# Altium footprint library discret_ic.pcblib: 55 footprints (part 1 of 4)
Each footprint in its own frame and in the unit in brackets; x right, y up, seen from the top. Pads: shape width x height; smd on the part's side, far side on the other; paste and mask are expansions set on the pad; w line width, h text height; cw(c..) or ccw(c..) is an arc to the next point about the centre after c.
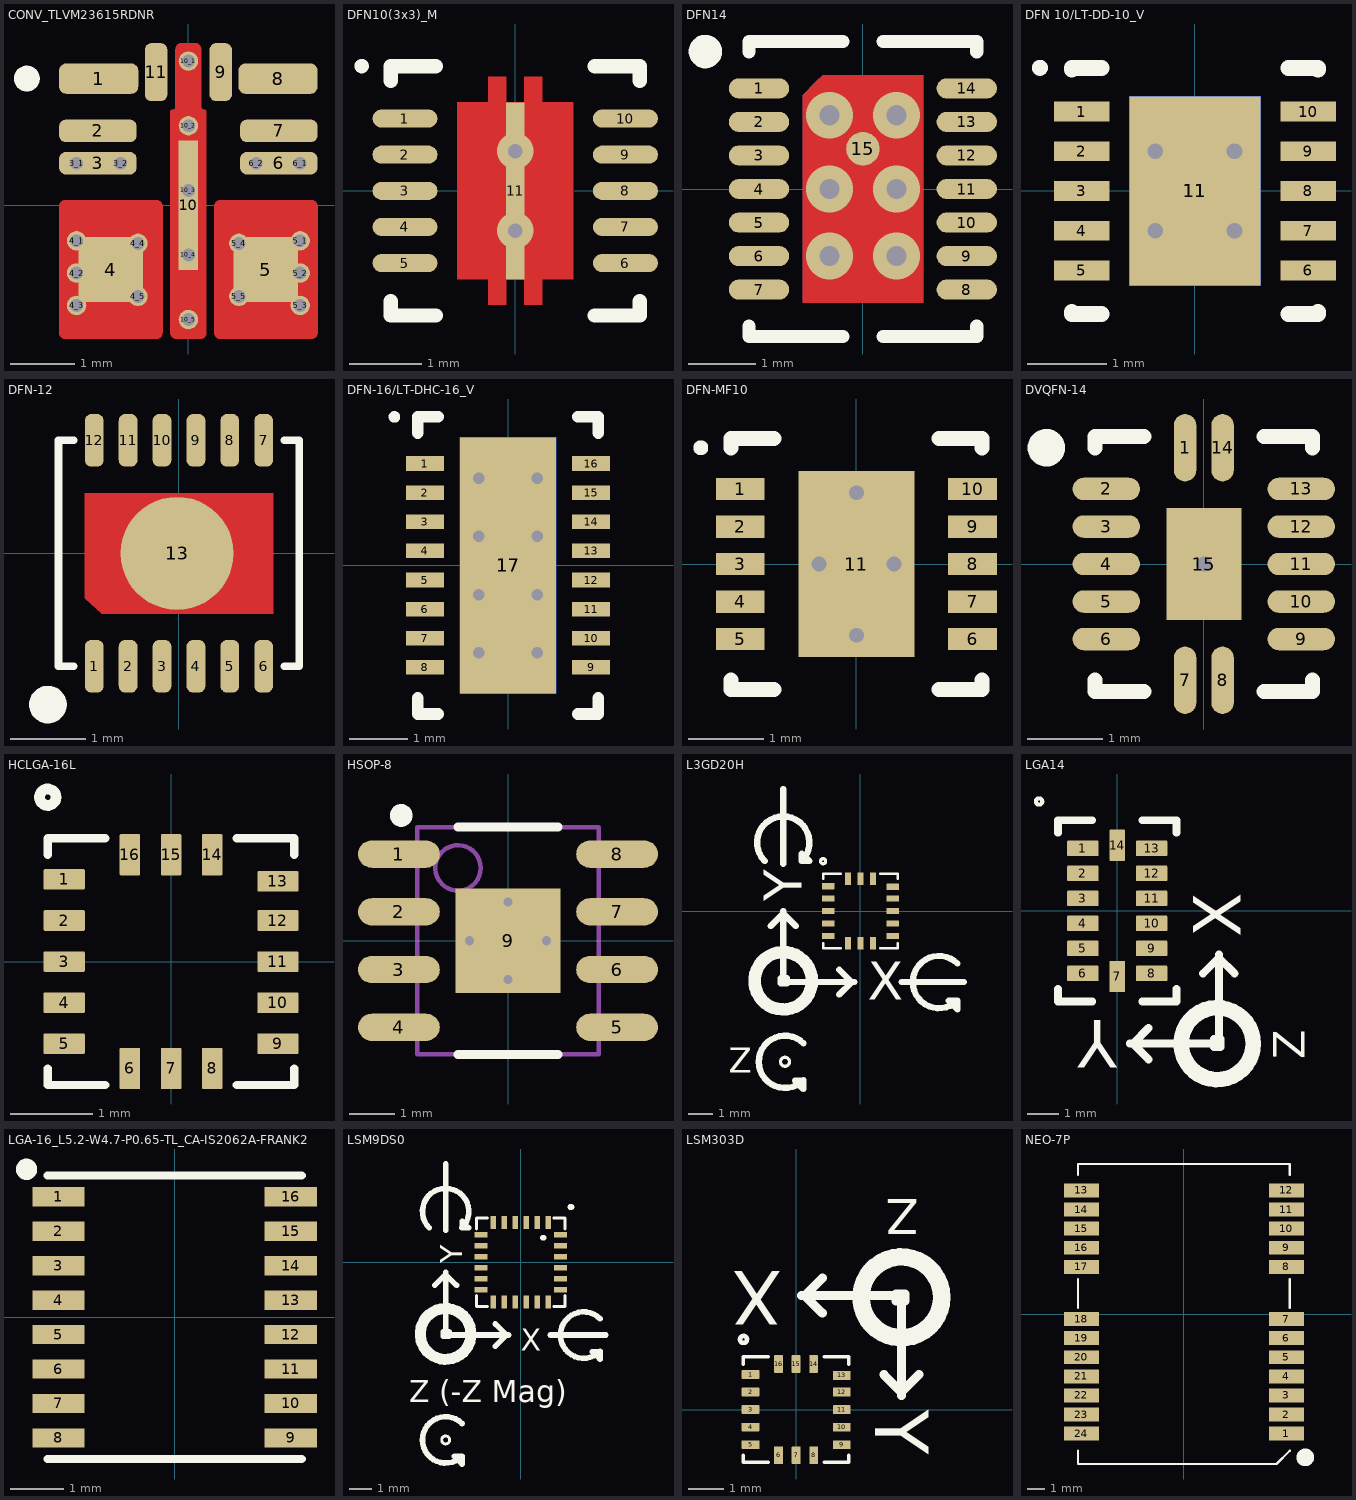
[diagram p0: the footprints below, top view; thin cyan lines are the x and y axes]

## CONV_TLVM23615RDNR [mm]
pads (30):
  rrect45% 1.225x0.47 smd paste-2 mask+0: 1(-1.388,1.96) 8(1.388,1.96)
  rrect60% 1.2x0.35 smd paste-2 mask+0: 2(-1.4,1.15) 3(-1.4,0.65) 6(1.4,0.65) 7(1.4,1.15)
  round 0.3 hole 0.2 mask+0: 3_1(-1.729,0.65) 3_2(-1.05,0.65) 4_1(-1.73,-0.55) 4_2(-1.73,-1.05) 4_3(-1.73,-1.55) 4_4(-0.78,-0.59) 4_5(-0.78,-1.41) 5_1(1.73,-0.55) 5_2(1.73,-1.05) 5_3(1.73,-1.55) 5_4(0.78,-0.59) 5_5(0.78,-1.41) 6_1(1.729,0.65) 6_2(1.05,0.65) 10_1(0,2.23) 10_2(0,1.23) 10_3(0,0.23) 10_4(0,-0.77) 10_5(0,-1.77)
  rect 1x1 smd paste-1 mask+0: 4(-1.2,-0.995) 5(1.2,-0.995)
  rrect60% 0.35x0.9 smd paste-1 mask+0: 9(0.5,2.06) 11(-0.5,2.06)
  rect 0.3x2 smd paste-2 mask+0: 10(0,0)
Top Layer:
  region: -0.49,0.079 -0.484,0.079 -0.479,0.078 -0.474,0.077 -0.469,0.075 -0.464,0.073 -0.459,0.071 -0.455,0.069 -0.45,0.067 -0.446,0.064 -0.441,0.061 -0.437,0.058 -0.433,0.054 -0.429,0.051 -0.426,0.047 -0.422,0.043 -0.419,0.039 -0.416,0.034 -0.413,0.03 -0.411,0.025 -0.409,0.021 -0.407,0.016 -0.405,0.011 -0.403,0.006 -0.402,0.001 -0.401,-0.004 -0.401,-0.01 -0.4,-0.015 -0.4,-0.02 -0.4,-1.97 -0.4,-1.975 -0.401,-1.98 -0.401,-1.986 -0.402,-1.991 -0.403,-1.996 -0.405,-2.001 -0.407,-2.006 -0.409,-2.011 -0.411,-2.015 -0.413,-2.02 -0.416,-2.024 -0.419,-2.029 -0.422,-2.033 -0.426,-2.037 -0.429,-2.041 -0.433,-2.044 -0.437,-2.048 -0.441,-2.051 -0.446,-2.054 -0.45,-2.057 -0.455,-2.059 -0.459,-2.061 -0.464,-2.063 -0.469,-2.065 -0.474,-2.067 -0.479,-2.068 -0.484,-2.069 -0.49,-2.069 -0.495,-2.07 -1.905,-2.07 -1.91,-2.069 -1.916,-2.069 -1.921,-2.068 -1.926,-2.067 -1.931,-2.065 -1.936,-2.063 -1.941,-2.061 -1.945,-2.059 -1.95,-2.057 -1.954,-2.054 -1.959,-2.051 -1.963,-2.048 -1.967,-2.044 -1.971,-2.041 -1.974,-2.037 -1.978,-2.033 -1.981,-2.029 -1.984,-2.024 -1.987,-2.02 -1.989,-2.015 -1.991,-2.011 -1.993,-2.006 -1.995,-2.001 -1.997,-1.996 -1.998,-1.991 -1.999,-1.986 -1.999,-1.98 -2,-1.975 -2,-1.97 -2,-0.02 -2,-0.015 -1.999,-0.01 -1.999,-0.004 -1.998,0.001 -1.997,0.006 -1.995,0.011 -1.993,0.016 -1.991,0.021 -1.989,0.025 -1.987,0.03 -1.984,0.034 -1.981,0.039 -1.978,0.043 -1.974,0.047 -1.971,0.051 -1.967,0.054 -1.963,0.058 -1.959,0.061 -1.954,0.064 -1.95,0.067 -1.945,0.069 -1.941,0.071 -1.936,0.073 -1.931,0.075 -1.926,0.077 -1.921,0.078 -1.916,0.079 -1.91,0.079 -1.905,0.08 -0.495,0.08
  region: 232 vertices and 0 holes, not listed, extent -0.28,-2.07 0.28,2.51
  region: 1.91,0.079 1.916,0.079 1.921,0.078 1.926,0.077 1.931,0.075 1.936,0.073 1.941,0.071 1.945,0.069 1.95,0.067 1.954,0.064 1.959,0.061 1.963,0.058 1.967,0.054 1.971,0.051 1.974,0.047 1.978,0.043 1.981,0.039 1.984,0.034 1.987,0.03 1.989,0.025 1.991,0.021 1.993,0.016 1.995,0.011 1.997,0.006 1.998,0.001 1.999,-0.004 1.999,-0.01 2,-0.015 2,-0.02 2,-1.97 2,-1.975 1.999,-1.98 1.999,-1.986 1.998,-1.991 1.997,-1.996 1.995,-2.001 1.993,-2.006 1.991,-2.011 1.989,-2.015 1.987,-2.02 1.984,-2.024 1.981,-2.029 1.978,-2.033 1.974,-2.037 1.971,-2.041 1.967,-2.044 1.963,-2.048 1.959,-2.051 1.954,-2.054 1.95,-2.057 1.945,-2.059 1.941,-2.061 1.936,-2.063 1.931,-2.065 1.926,-2.067 1.921,-2.068 1.916,-2.069 1.91,-2.069 1.905,-2.07 0.495,-2.07 0.49,-2.069 0.484,-2.069 0.479,-2.068 0.474,-2.067 0.469,-2.065 0.464,-2.063 0.459,-2.061 0.455,-2.059 0.45,-2.057 0.446,-2.054 0.441,-2.051 0.437,-2.048 0.433,-2.044 0.429,-2.041 0.426,-2.037 0.422,-2.033 0.419,-2.029 0.416,-2.024 0.413,-2.02 0.411,-2.015 0.409,-2.011 0.407,-2.006 0.405,-2.001 0.403,-1.996 0.402,-1.991 0.401,-1.986 0.401,-1.98 0.4,-1.975 0.4,-1.97 0.4,-0.02 0.4,-0.015 0.401,-0.01 0.401,-0.004 0.402,0.001 0.403,0.006 0.405,0.011 0.407,0.016 0.409,0.021 0.411,0.025 0.413,0.03 0.416,0.034 0.419,0.039 0.422,0.043 0.426,0.047 0.429,0.051 0.433,0.054 0.437,0.058 0.441,0.061 0.446,0.064 0.45,0.067 0.455,0.069 0.459,0.071 0.464,0.073 0.469,0.075 0.474,0.077 0.479,0.078 0.484,0.079 0.49,0.079 0.495,0.08 1.905,0.08
Top Overlay:
  circle w0.2: c-2.5,1.96 r0.1
Top Paste:
  drawing of 23 lines, arcs and shapes, not listed
Top Solder:
  drawing of 11 lines, arcs and shapes, not listed
3D body "step_temp.STEP": height 2.1, standoff 0, extent -1.75,-2.25 1.75,2.25

## DFN10(3x3)_M [mm] "SON, 10-Leads, Body 3x3mm, Pitch 0.5mm, Thermal Pad 2.45x1.6mm, IPC Low Density"
height 1
pads (11):
  oval 0.9x0.25 smd: 1(-1.525,1) 2(-1.525,0.5) 3(-1.525,0) 4(-1.525,-0.5) 5(-1.525,-1) 6(1.525,-1) 7(1.525,-0.5) 8(1.525,0) 9(1.525,0.5) 10(1.525,1)
  rect 0.25x2.45 smd paste+0 mask+0: 11(0,0)
via 0,0.55 diameter 0.5 hole 0.2
via 0,-0.55 diameter 0.5 hole 0.2
Top Layer:
  region: -0.8,-1.225 -0.375,-1.225 -0.375,-1.575 -0.125,-1.575 -0.125,-1.225 0.125,-1.225 0.125,-1.575 0.375,-1.575 0.375,-1.225 0.8,-1.225 0.8,1.225 0.375,1.225 0.375,1.575 0.125,1.575 0.125,1.225 -0.125,1.225 -0.125,1.575 -0.375,1.575 -0.375,1.225 -0.8,1.225
Top Overlay:
  circle w0.1: c-2.125,1.725 r0.05
  lines w0.2: -1.725,-1.525 -1.725,-1.725 -1.1,-1.725 ; -1.725,1.525 -1.725,1.725 -1.1,1.725 ; 1.1,-1.725 1.725,-1.725 1.725,-1.525 ; 1.1,1.725 1.725,1.725 1.725,1.525
3D body "User Library-My-DFN-10-3x3-0_5.STEP": height 0.8, standoff 0, extent -1.57,-1.55 1.55,1.55

## DFN14 [mm]
pads (15):
  oval 0.9x0.3 smd: 1(-1.55,1.5) 2(-1.55,1) 3(-1.55,0.5) 4(-1.55,0) 5(-1.55,-0.5) 6(-1.55,-1) 7(-1.55,-1.5) 8(1.55,-1.5) 9(1.55,-1) 10(1.55,-0.5) 11(1.55,0) 12(1.55,0.5) 13(1.55,1) 14(1.55,1.5)
  round 0.5 smd: 15(0,0.6)
via -0.5,1.1 diameter 0.7 hole 0.3
via 0.5,1.1 diameter 0.7 hole 0.3
via -0.5,0 diameter 0.7 hole 0.3
via 0.5,0 diameter 0.7 hole 0.3
via -0.5,-1 diameter 0.7 hole 0.3
via 0.5,-1 diameter 0.7 hole 0.3
Top Layer:
  region: -0.9,-1.7 -0.9,1.4 -0.7,1.6 -0.6,1.7 0.9,1.7 0.9,-1.7
Bottom Layer:
  region: -0.9,-1.7 -0.9,1.4 -0.7,1.6 -0.6,1.7 0.9,1.7 0.9,-1.7
Top Overlay:
  circle w0.25: c-2.35,2.05 r0.125
  lines w0.2: -1.7,-2.05 -1.7,-2.2 -0.3,-2.2 ; -1.7,2.05 -1.7,2.2 -0.3,2.2 ; 0.3,-2.2 1.7,-2.2 1.7,-2.05 ; 0.3,2.2 1.7,2.2 1.7,2.05
Top Solder:
  region: -0.9,-1.7 -0.9,1.4 -0.7,1.6 -0.6,1.7 0.9,1.7 0.9,-1.7
3D body "User Library-LT3479EDE#PBF-2.step": height 0.75, standoff 0, extent -1.5,-2 1.5,2

## DFN 10/LT-DD-10_V [mm] "SON, 10-Leads, Body 3x3mm, Pitch 0.5mm, Thermal Pad 2.38x1.65mm"
height 0.8
pads (12):
  rect 0.7x0.25 smd mask+0.102: 1(-1.425,1) 2(-1.425,0.5) 3(-1.425,0) 4(-1.425,-0.5) 5(-1.425,-1) 6(1.425,-1) 7(1.425,-0.5) 8(1.425,0) 9(1.425,0.5) 10(1.425,1)
  rect 1.65x2.38 smd mask+0.102: 11(0,0)
  rect 1.65x2.38 smd far side mask+0.102: 11(0,0)
via -0.5,0.5 diameter 0.5 hole 0.2
via 0.5,0.5 diameter 0.5 hole 0.2
via -0.5,-0.5 diameter 0.5 hole 0.2
via 0.5,-0.5 diameter 0.5 hole 0.2
Top Overlay:
  circle w0.1: c-1.95,1.55 r0.05
  lines w0.2: -1.55,-1.525 -1.55,-1.55 -1.175,-1.55 ; -1.55,1.525 -1.55,1.55 -1.175,1.55 ; 1.175,-1.55 1.55,-1.55 1.55,-1.525 ; 1.175,1.55 1.55,1.55 1.55,1.525
3D body "User Library-DFN10-1.STEP": height 0.8, standoff 0, extent -1.51,-1.5 1.51,1.5

## DFN-12 [mm]
pads (13):
  rrect70% 0.25x0.7 smd mask+0.05: 1(-1.125,-1.5) 2(-0.675,-1.5) 3(-0.225,-1.5) 4(0.225,-1.5) 5(0.675,-1.5) 6(1.125,-1.5) 7(1.125,1.5) 8(0.675,1.5) 9(0.225,1.5) 10(-0.225,1.5) 11(-0.675,1.5) 12(-1.125,1.5)
  round 1.5 smd paste+0 mask+0: 13(-0.025,0)
Top Layer:
  region: -1.25,0.8 1.25,0.8 1.25,-0.8 -1.025,-0.8 -1.25,-0.6
Top Overlay:
  circle w0.25: c-1.74,-2.009 r0.125
  lines w0.1: -1.4,-1.5 -1.6,-1.5 -1.6,1.5 -1.4,1.5 ; 1.4,-1.5 1.6,-1.5 1.6,1.5 1.4,1.5
Top Solder:
  region: -1.25,0.8 1.25,0.8 1.25,-0.8 -1.025,-0.8 -1.25,-0.6
3D body "User Library-DFN12(3x3).step": height 0.76, standoff 0, extent -1.5,-1.5 1.5,1.502

## DFN-16/LT-DHC-16_V [mm] "SON, 16-Leads, Body 5x3mm, Pitch 0.5mm, Thermal Pad 4.4X1.65mm"
height 0.8
pads (18):
  rect 0.65x0.25 smd: 1(-1.425,1.75) 2(-1.425,1.25) 3(-1.425,0.75) 4(-1.425,0.25) 5(-1.425,-0.25) 6(-1.425,-0.75) 7(-1.425,-1.25) 8(-1.425,-1.75) 9(1.425,-1.75) 10(1.425,-1.25) 11(1.425,-0.75) 12(1.425,-0.25) 13(1.425,0.25) 14(1.425,0.75) 15(1.425,1.25) 16(1.425,1.75)
  rect 1.65x4.4 smd: 17(0,0)
  rect 1.65x4.4 smd far side: 17(0,0)
via 0.5,-1.5 diameter 0.5 hole 0.2
via -0.5,-1.5 diameter 0.5 hole 0.2
via 0.5,-0.5 diameter 0.5 hole 0.2
via -0.5,-0.5 diameter 0.5 hole 0.2
via 0.5,0.5 diameter 0.5 hole 0.2
via -0.5,0.5 diameter 0.5 hole 0.2
via 0.5,1.5 diameter 0.5 hole 0.2
via -0.5,1.5 diameter 0.5 hole 0.2
Top Overlay:
  circle w0.1: c-1.95,2.55 r0.05
  lines w0.2: -1.55,-2.275 -1.55,-2.55 -1.2,-2.55 ; -1.55,2.275 -1.55,2.55 -1.2,2.55 ; 1.2,-2.55 1.55,-2.55 1.55,-2.275 ; 1.2,2.55 1.55,2.55 1.55,2.275
3D body "User Library-My-DFN-16-5x3-0_5.STEP": height 0.8, standoff 0, extent -1.56,-2.55 1.56,2.55

## DFN-MF10 [mm] "SON, 10-Leads, Body 3x3mm, Pitch 0.5mm, Microchip Recommended"
height 1
pads (11):
  rect 0.65x0.3 smd: 1(-1.55,1) 2(-1.55,0.5) 3(-1.55,0) 4(-1.55,-0.5) 5(-1.55,-1) 6(1.55,-1) 7(1.55,-0.5) 8(1.55,0) 9(1.55,0.5) 10(1.55,1)
  rect 1.55x2.48 smd: 11(0,0)
via -0.5,0 diameter 0.5 hole 0.2
via 0.5,0 diameter 0.5 hole 0.2
via 0,0.95 diameter 0.5 hole 0.2
via 0,-0.95 diameter 0.5 hole 0.2
Top Overlay:
  circle w0.1: c-2.075,1.55 r0.05
  lines w0.2: -1.675,-1.55 -1.675,-1.675 -1.1,-1.675 ; -1.675,1.55 -1.675,1.675 -1.1,1.675 ; 1.1,-1.675 1.675,-1.675 1.675,-1.55 ; 1.1,1.675 1.675,1.675 1.675,1.55
3D body: height 1, standoff 0, extent -1.524,-1.524 1.524,1.524

## DVQFN-14 [mm] "QFN, 14-Leads, Body 2,50x3,00mm, Pitch 0,50mm, Thermal Pad 1,00x1,50mm, IPC Low Density"
height 1
pads (15):
  oval 0.3x0.9 smd: 1(-0.25,1.55) 7(-0.25,-1.55) 8(0.25,-1.55) 14(0.25,1.55)
  oval 0.9x0.3 smd: 2(-1.3,1) 3(-1.3,0.5) 4(-1.3,0) 5(-1.3,-0.5) 6(-1.3,-1) 9(1.3,-1) 10(1.3,-0.5) 11(1.3,0) 12(1.3,0.5) 13(1.3,1)
  rect 1x1.5 smd: 15(0,0)
via 0,0 diameter 0.5 hole 0.2
Top Overlay:
  circle w0.25: c-2.1,1.55 r0.125
  lines w0.2: -1.45,-1.55 -1.45,-1.7 -0.8,-1.7 ; -1.45,1.55 -1.45,1.7 -0.8,1.7 ; 0.8,-1.7 1.45,-1.7 1.45,-1.55 ; 0.8,1.7 1.45,1.7 1.45,1.55
3D body "User Library-DHVQFN 14.STEP": height 0.85, standoff -0.02, extent -1.251,-1.501 1.251,1.501

## HCLGA-16L [mm]
height 1
pads (16):
  rrect10% 0.5x0.25 smd mask+0: 1(-1.3,1) 2(-1.3,0.5) 3(-1.3,0) 4(-1.3,-0.5) 5(-1.3,-1) 9(1.3,-1) 10(1.3,-0.5) 11(1.3,0) 12(1.3,0.5) 13(1.3,0.975)
  rrect10% 0.25x0.5 smd mask+0: 6(-0.5,-1.3) 7(0,-1.3) 8(0.5,-1.3) 14(0.5,1.3) 15(0,1.3) 16(-0.5,1.3)
via -4.25,0 diameter 3 hole 2.2
via 4.25,0 diameter 3 hole 2.2
via 0,-4.25 diameter 3 hole 2.2
via 0,4.25 diameter 3 hole 2.2
Top Overlay:
  circle w0.13: c-1.5,2 r0.1
  lines w0.1: -1.5,-1.3 -1.5,-1.5 -0.8,-1.5 ; -1.5,1.3 -1.5,1.5 -0.8,1.5 ; 0.8,-1.5 1.5,-1.5 1.5,-1.3 ; 0.8,1.5 1.5,1.5 1.5,1.3
3D body: height 1.1, standoff 0.1, extent -1.5,-1.5 1.5,1.5
3D body "????? ?? ?????? ????????.stp": height 9.5, standoff 0, extent -5.953,-5.988 6,5.988

## HSOP-8 [mm]
pads (9):
  oval 1.8x0.6 smd: 1(-2.4,1.905) 2(-2.4,0.635) 3(-2.4,-0.635) 4(-2.4,-1.905) 5(2.4,-1.905) 6(2.4,-0.635) 7(2.4,0.635) 8(2.4,1.905)
  rect 2.3x2.3 smd paste-1.15: 9(0,0)
via 0.85,0 diameter 0.5 hole 0.2
via -0.85,0 diameter 0.5 hole 0.2
via 0,0.85 diameter 0.5 hole 0.2
via 0,-0.85 diameter 0.5 hole 0.2
Top Overlay:
  circle w0.25: c-2.35,2.755 r0.125
  lines w0.2: -1.1,-2.5 1.1,-2.5 ; -1.1,2.5 1.1,2.5
Top Paste:
  region: 0.1,-0.1 0.1,-1.05 1.05,-1.05 1.05,-0.1
  region: -0.1,-0.1 -1.05,-0.1 -1.05,-1.05 -0.1,-1.05
  region: -0.1,0.1 -0.1,1.05 -1.05,1.05 -1.05,0.1
  rectangle: 0.1,0.1 1.05,1.05
Plata3D:
  circle w0.1: c-1.1,1.6 r0.5
  lines w0.1: -2,-2.5 2,-2.5 2,2.5 -2,2.5 -2,-2.5
3D body: height 1.7, standoff 0, extent -2,-2.5 2,2.5

## L3GD20H [mm]
pads (16):
  rrect10% 0.5x0.25 smd mask+0: 1(-1.3,1) 2(-1.3,0.5) 3(-1.3,0) 4(-1.3,-0.5) 5(-1.3,-1) 9(1.3,-1) 10(1.3,-0.5) 11(1.3,0) 12(1.3,0.5) 13(1.3,0.975)
  rrect10% 0.25x0.5 smd mask+0: 6(-0.5,-1.3) 7(0,-1.3) 8(0.5,-1.3) 14(0.5,1.3) 15(0,1.3) 16(-0.5,1.3)
Top Overlay:
  circle w0.13: c-1.5,2 r0.1
  circle w0.5: c-3.1,-2.8 r1.151
  circle w0.13: c-3.03,-6.05 r0.18
  lines w0.1: -1.5,-1.3 -1.5,-1.5 -0.8,-1.5 ; -1.5,1.3 -1.5,1.5 -0.8,1.5 ; 0.8,-1.5 1.5,-1.5 1.5,-1.3 ; 0.8,1.5 1.5,1.5 1.5,1.3
  lines w0.254: -3.885,2.05 -3.85,2.015 ; -3.842,2.008 cw(c-3.1,2.75) -2.358,2.008 ; -3.6,-0.6 -3.1,-0.1 ; -3.1,-2.8 -3.05,-2.8 -2.95,-2.7 -3.2,-2.7 -3.2,-2.9 -2.95,-2.9 ; -3.1,1.9 -3.1,4.9 ; -2.6,-0.6 -3.1,-0.1 ; -2.38,-6.95 -2.33,-6.9 -2.33,-6.835 -2.295,-6.8 -2.63,-6.8 -2.288,-7.142 -2.288,-6.792 cw(c-3.03,-6.05) -2.288,-5.308 ; -0.85,-3.35 -0.35,-2.85 ; -0.85,-2.35 -0.35,-2.85 ; 1.65,-2.85 4.15,-2.85 ; 3.8,-3.75 3.85,-3.7 3.85,-3.635 3.885,-3.6 3.55,-3.6 3.892,-3.942 3.892,-3.592 cw(c3.15,-2.85) 3.892,-2.108 ; -3.1,-0.1 -3.1,0 ; -3.1,-0.1 -3.1,0 ; -3.1,0 -3.1,-2.85 -0.25,-2.85 ; -2.358,2.008 -2.35,2.015 -2.35,2.3 -2.058,2.008 -2.358,2.008 ; -0.35,-2.85 -0.25,-2.85 ; -0.35,-2.85 -0.25,-2.85
  text "Z" at -5.28,-6.5 h1
  text "Y" at -2.35,0.4 h1.52
  text "X" at 0.3,-3.55 h1.52
3D body: height 1.1, standoff 0.1, extent -1.5,-1.5 1.5,1.5

## LGA14 [mm]
height 1
pads (14):
  rrect10% 1x0.5 smd mask+0: 1(-1.1,2) 2(-1.1,1.2) 3(-1.1,0.4) 4(-1.1,-0.4) 5(-1.1,-1.2) 6(-1.1,-2) 8(1.1,-2) 9(1.1,-1.2) 10(1.1,-0.4) 11(1.1,0.4) 12(1.1,1.2) 13(1.1,2)
  rrect10% 0.5x1 smd mask+0: 7(0,-2.1) 14(0,2.1)
Top Overlay:
  circle w0.13: c-2.5,3.5 r0.1
  circle w0.5: c3.2,-4.25 r1.151
  lines w0.254: -1.9,-2.5 -1.9,-2.9 -0.8,-2.9 ; -1.9,2.5 -1.9,2.9 -0.8,2.9 ; 0.8,-2.9 1.9,-2.9 1.9,-2.5 ; 0.8,2.9 1.9,2.9 1.9,2.5 ; 1,-4.75 0.5,-4.25 ; 1,-3.75 0.5,-4.25 ; 2.75,-2 3.25,-1.5 ; 3.2,-4.25 3.2,-4.2 3.1,-4.1 3.1,-4.35 3.3,-4.35 3.3,-4.1 ; 3.75,-2 3.25,-1.5 ; 0.4,-4.25 0.5,-4.25 ; 0.4,-4.25 0.5,-4.25 ; 0.4,-4.25 3.25,-4.25 3.25,-1.4 ; 3.25,-1.5 3.25,-1.4 ; 3.25,-1.5 3.25,-1.4
  text "X" at 3.95,-0.85 h1.52
  text "Y" at 0,-3.5 h1.52
  text "Z" at 6,-4.75 h1
3D body: height 1.1, standoff 0.1, extent -1.5,-2.5 1.5,2.5

## LGA-16_L5.2-W4.7-P0.65-TL_CA-IS2062A-FRANK2 [mm]
pads (16):
  rect 0.985x0.364 smd: 1(-2.193,2.275) 2(-2.193,1.625) 3(-2.193,0.975) 4(-2.193,0.325) 5(-2.193,-0.325) 6(-2.193,-0.975) 7(-2.193,-1.625) 8(-2.193,-2.275) 9(2.193,-2.275) 10(2.193,-1.625) 11(2.193,-0.975) 12(2.193,-0.325) 13(2.193,0.325) 14(2.193,0.975) 15(2.193,1.625) 16(2.193,2.275)
Top Overlay:
  circle w0.2: c-2.794,2.794 r0.1
  lines w0.152: -2.401,-2.676 2.401,-2.676 ; -2.401,2.676 2.401,2.676
3D body "IuCE-U2-LGA-16_L5.2-W4.7-P0.65-TL_CA-IS2062A-FRANK2.stp": height 0.99, standoff 0, extent -2.351,-2.6 2.351,2.6

## LSM9DS0 [mm]
pads (24):
  rrect10% 0.25x0.6 smd mask+0: 1(1.25,1.8) 2(0.75,1.8) 3(0.25,1.8) 4(-0.25,1.8) 5(-0.75,1.8) 6(-1.25,1.8) 13(-1.25,-1.8) 14(-0.75,-1.8) 15(-0.25,-1.8) 16(0.25,-1.8) 17(0.75,-1.8) 18(1.25,-1.8)
  rrect10% 0.6x0.25 smd mask+0: 7(-1.8,1.25) 8(-1.8,0.75) 9(-1.8,0.25) 10(-1.8,-0.25) 11(-1.8,-0.75) 12(-1.8,-1.25) 19(1.8,-1.25) 20(1.8,-0.75) 21(1.8,-0.25) 22(1.8,0.25) 23(1.8,0.75) 24(1.8,1.25)
Top Overlay:
  circle w0.5: c-3.4,-3.25 r1.151
  circle w0.13: c-3.4,-8.05 r0.18
  lines w0.13: -2,-1.5 -2,-2 -1.5,-2 ; -2,1.5 -2,2 -1.5,2 ; 1.5,-2 2,-2 2,-1.5 ; 1.5,2 2,2 2,1.5
  lines w0.254: -4.185,1.6 -4.15,1.565 ; -4.142,1.558 cw(c-3.4,2.3) -2.658,1.558 ; -3.9,-1.05 -3.4,-0.55 ; -3.4,-3.25 -3.35,-3.25 -3.25,-3.15 -3.5,-3.15 -3.5,-3.35 -3.25,-3.35 ; -3.4,1.45 -3.4,4.45 ; -2.9,-1.05 -3.4,-0.55 ; -2.75,-8.95 -2.7,-8.9 -2.7,-8.835 -2.665,-8.8 -3,-8.8 -2.658,-9.142 -2.658,-8.792 cw(c-3.4,-8.05) -2.658,-7.308 ; -1.15,-3.8 -0.65,-3.3 ; -1.15,-2.8 -0.65,-3.3 ; 1,1.1 1.05,1.1 ; 1.35,-3.3 3.85,-3.3 ; 2.25,2.5 2.3,2.5 2.275,2.5 ; 3.5,-4.2 3.55,-4.15 3.55,-4.085 3.585,-4.05 3.25,-4.05 3.592,-4.392 3.592,-4.042 cw(c2.85,-3.3) 3.592,-2.558 ; -3.4,-0.55 -3.4,-0.45 ; -3.4,-0.55 -3.4,-0.45 ; -3.4,-0.45 -3.4,-3.3 -0.55,-3.3 ; -2.658,1.558 -2.65,1.565 -2.65,1.85 -2.358,1.558 -2.658,1.558 ; -0.65,-3.3 -0.55,-3.3 ; -0.65,-3.3 -0.55,-3.3
  text "Z (-Z Mag)" at -5.05,-6.35 h1
  text "Y" at -2.65,-0.05 h1
  text "X" at 0,-4 h1
3D body: height 1.12, standoff 0.05, extent -2,-2 2,2

## LSM303D [mm]
pads (16):
  rrect10% 0.5x0.25 smd mask+0: 1(-1.3,1) 2(-1.3,0.5) 3(-1.3,0) 4(-1.3,-0.5) 5(-1.3,-1) 9(1.3,-1) 10(1.3,-0.5) 11(1.3,0) 12(1.3,0.5) 13(1.3,0.975)
  rrect10% 0.25x0.5 smd mask+0: 6(-0.5,-1.3) 7(0,-1.3) 8(0.5,-1.3) 14(0.5,1.3) 15(0,1.3) 16(-0.5,1.3)
Top Overlay:
  circle w0.5: c3,3.2 r1.151
  circle w0.13: c-1.5,2 r0.1
  lines w0.1: -1.5,-1.3 -1.5,-1.5 -0.8,-1.5 ; -1.5,1.3 -1.5,1.5 -0.8,1.5 ; 0.8,-1.5 1.5,-1.5 1.5,-1.3 ; 0.8,1.5 1.5,1.5 1.5,1.3
  lines w0.254: 0.75,2.75 0.25,3.25 ; 0.75,3.75 0.25,3.25 ; 2.5,1 3,0.5 3.5,1 ; 2.85,3.3 3.1,3.3 3.1,3.1 2.85,3.1 2.95,3.2 3,3.2 ; 3,0.4 3,3.25 0.15,3.25 ; 0.15,3.25 0.25,3.25 ; 0.15,3.25 0.25,3.25
  text "Z" at 3.5,6 h1
  text "Y" at 2.25,0 h1.52
  text "X" at -0.4,3.95 h1.52
3D body: height 1.1, standoff 0.1, extent -1.5,-1.5 1.5,1.5

## NEO-7P [mm]
pads (24):
  rect 2x0.8 smd paste-25.4 mask-25.4: 1(5.904,-6.888) 2(5.904,-5.788) 3(5.904,-4.688) 4(5.904,-3.588) 5(5.904,-2.488) 6(5.904,-1.388) 7(5.904,-0.288) 8(5.904,2.712) 9(5.904,3.812) 10(5.904,4.912) 11(5.904,6.012) 12(5.904,7.112) 13(-5.896,7.112) 14(-5.896,6.012) 15(-5.896,4.912) 16(-5.896,3.812) 17(-5.896,2.712) 18(-5.896,-0.288) 19(-5.896,-1.388) 20(-5.896,-2.488) 21(-5.896,-3.588) 22(-5.896,-4.688) 23(-5.896,-5.788) 24(-5.896,-6.888)
Top Overlay:
  circle w0.508: c6.985,-8.255 r0.254
  lines w0.127: -6.096,-7.874 -6.096,-8.636 5.334,-8.636 6.096,-7.874 ; -6.096,0.35 -6.096,2 ; -6.096,8.001 -6.096,8.636 6.096,8.636 6.096,8.001 ; 6.096,0.35 6.096,2
Top Paste:
  region: 4.904,-7.288 6.904,-7.288 6.904,-6.488 4.904,-6.488
  region: 4.904,-6.188 6.904,-6.188 6.904,-5.388 4.904,-5.388
  region: 4.904,-5.088 6.904,-5.088 6.904,-4.288 4.904,-4.288
  region: 4.904,-3.988 6.904,-3.988 6.904,-3.188 4.904,-3.188
  region: 4.904,-2.888 6.904,-2.888 6.904,-2.088 4.904,-2.088
  region: 4.904,-1.788 6.904,-1.788 6.904,-0.988 4.904,-0.988
  region: 4.904,-0.688 6.904,-0.688 6.904,0.112 4.904,0.112
  region: 4.904,2.312 6.904,2.312 6.904,3.112 4.904,3.112
  region: 4.904,3.412 6.904,3.412 6.904,4.212 4.904,4.212
  region: 4.904,4.512 6.904,4.512 6.904,5.312 4.904,5.312
  region: 4.904,5.612 6.904,5.612 6.904,6.412 4.904,6.412
  region: 4.904,6.712 6.904,6.712 6.904,7.512 4.904,7.512
  region: -6.896,6.712 -4.896,6.712 -4.896,7.512 -6.896,7.512
  region: -6.896,5.612 -4.896,5.612 -4.896,6.412 -6.896,6.412
  region: -6.896,4.512 -4.896,4.512 -4.896,5.312 -6.896,5.312
  region: -6.896,3.412 -4.896,3.412 -4.896,4.212 -6.896,4.212
  region: -6.896,2.312 -4.896,2.312 -4.896,3.112 -6.896,3.112
  region: -6.896,-0.688 -4.896,-0.688 -4.896,0.112 -6.896,0.112
  region: -6.896,-1.788 -4.896,-1.788 -4.896,-0.988 -6.896,-0.988
  region: -6.896,-2.888 -4.896,-2.888 -4.896,-2.088 -6.896,-2.088
  region: -6.896,-3.988 -4.896,-3.988 -4.896,-3.188 -6.896,-3.188
  region: -6.896,-5.088 -4.896,-5.088 -4.896,-4.288 -6.896,-4.288
  region: -6.896,-6.188 -4.896,-6.188 -4.896,-5.388 -6.896,-5.388
  region: -6.896,-7.288 -4.896,-7.288 -4.896,-6.488 -6.896,-6.488
Top Solder:
  region: 4.804,-7.388 7.004,-7.388 7.004,-6.388 4.804,-6.388
  region: 4.804,-6.288 7.004,-6.288 7.004,-5.288 4.804,-5.288
  region: 4.804,-5.188 7.004,-5.188 7.004,-4.188 4.804,-4.188
  region: 4.804,-4.088 7.004,-4.088 7.004,-3.088 4.804,-3.088
  region: 4.804,-2.988 7.004,-2.988 7.004,-1.988 4.804,-1.988
  region: 4.804,-1.888 7.004,-1.888 7.004,-0.888 4.804,-0.888
  region: 4.804,-0.788 7.004,-0.788 7.004,0.212 4.804,0.212
  region: 4.804,2.212 7.004,2.212 7.004,3.212 4.804,3.212
  region: 4.804,3.312 7.004,3.312 7.004,4.312 4.804,4.312
  region: 4.804,4.412 7.004,4.412 7.004,5.412 4.804,5.412
  region: 4.804,5.512 7.004,5.512 7.004,6.512 4.804,6.512
  region: 4.804,6.612 7.004,6.612 7.004,7.612 4.804,7.612
  region: -6.996,6.612 -4.796,6.612 -4.796,7.612 -6.996,7.612
  region: -6.996,5.512 -4.796,5.512 -4.796,6.512 -6.996,6.512
  region: -6.996,4.412 -4.796,4.412 -4.796,5.412 -6.996,5.412
  region: -6.996,3.312 -4.796,3.312 -4.796,4.312 -6.996,4.312
  region: -6.996,2.212 -4.796,2.212 -4.796,3.212 -6.996,3.212
  region: -6.996,-0.788 -4.796,-0.788 -4.796,0.212 -6.996,0.212
  region: -6.996,-1.888 -4.796,-1.888 -4.796,-0.888 -6.996,-0.888
  region: -6.996,-2.988 -4.796,-2.988 -4.796,-1.988 -6.996,-1.988
  region: -6.996,-4.088 -4.796,-4.088 -4.796,-3.088 -6.996,-3.088
  region: -6.996,-5.188 -4.796,-5.188 -4.796,-4.188 -6.996,-4.188
  region: -6.996,-6.288 -4.796,-6.288 -4.796,-5.288 -6.996,-5.288
  region: -6.996,-7.388 -4.796,-7.388 -4.796,-6.388 -6.996,-6.388
3D body "User Library-UBLOX_GPS_NEO-6M.step": height 2.64, standoff 0, extent -6.18,-8.2 6.18,8.4